# Altium footprint library ICs And Semiconductors SMD.PcbLib: 943 footprints (part 8 of 60)
Each footprint in its own frame and in the unit in brackets; x right, y up, seen from the top. Pads: shape width x height; smd on the part's side, far side on the other; paste and mask are expansions set on the pad; w line width, h text height; cw(c..) or ccw(c..) is an arc to the next point about the centre after c.
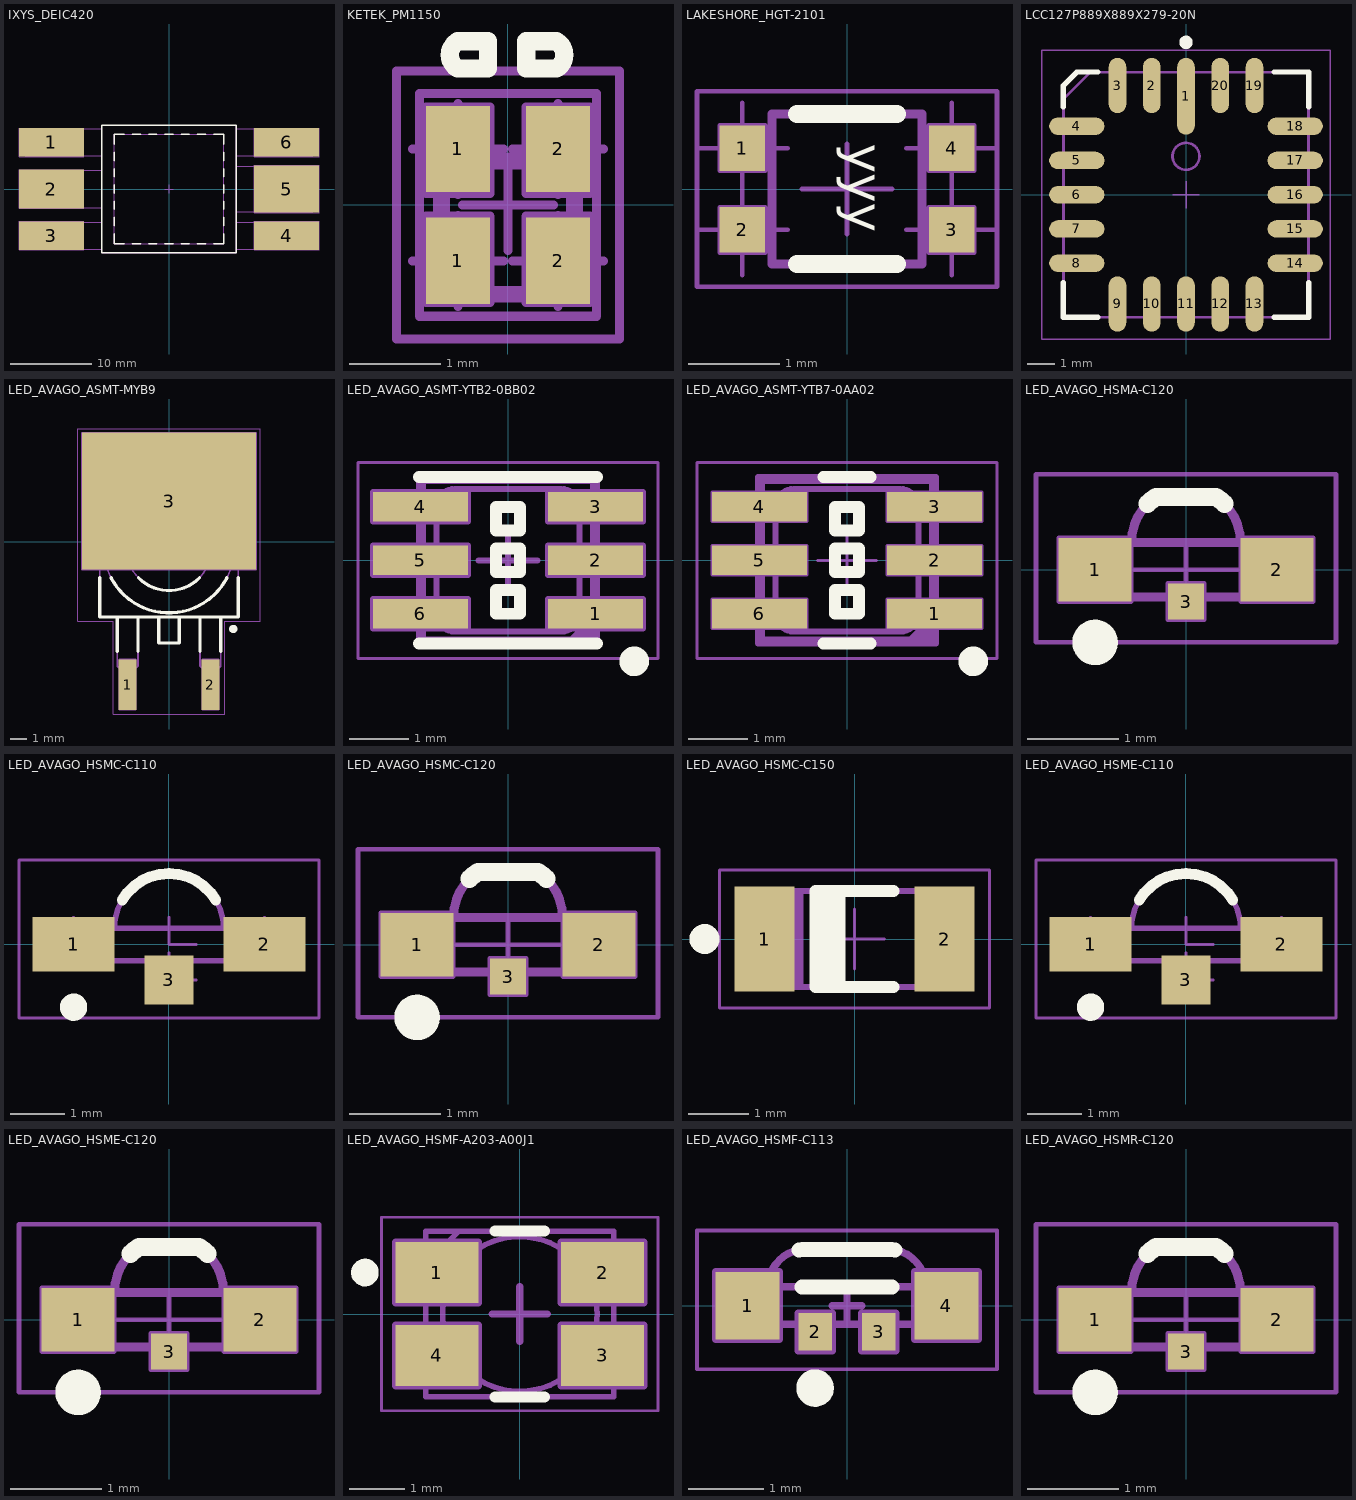
[diagram p7: the footprints below, top view; thin cyan lines are the x and y axes]

## IXYS_DEIC420 [mm] "IXYS DIRECT ENERGY INC. Case DEI420"
height 2.67
pads (6):
  rect 7.95x3.5 smd: 1(-14.425,5.715) 3(-14.425,-5.715) 4(14.425,-5.715) 6(14.425,5.715)
  rect 7.95x4.77 smd: 2(-14.425,0)
  rect 7.95x5.79 smd: 5(14.425,0)
Top Overlay:
  lines w0.2: -6.73,-5.5 -6.73,-6.73 -5.5,-6.73 ; -6.73,-4.5 -6.73,-3.5 ; -6.73,-2.5 -6.73,-1.5 ; -6.73,-0.5 -6.73,0.5 ; -6.73,1.5 -6.73,2.5 ; -6.73,3.5 -6.73,4.5 ; -6.73,5.5 -6.73,6.73 -5.5,6.73 ; -4.5,-6.73 -3.5,-6.73 ; -4.5,6.73 -3.5,6.73 ; -2.5,-6.73 -1.5,-6.73 ; -2.5,6.73 -1.5,6.73 ; -0.5,-6.73 0.5,-6.73 ; -0.5,6.73 0.5,6.73 ; 1.5,-6.73 2.5,-6.73 ; 1.5,6.73 2.5,6.73 ; 3.5,-6.73 4.5,-6.73 ; 3.5,6.73 4.5,6.73 ; 5.5,-6.73 6.73,-6.73 6.73,-5.5 ; 5.5,6.73 6.73,6.73 6.73,5.5 ; 6.73,-4.5 6.73,-3.5 ; 6.73,-2.5 6.73,-1.5 ; 6.73,-0.5 6.73,0.5 ; 6.73,1.5 6.73,2.5 ; 6.73,3.5 6.73,4.5 ; -8.255,-7.8 -8.255,7.8 8.255,7.8 8.255,-7.8 -8.255,-7.8
Mechanical 8:
  lines w0.1: -14.925,-5.715 -14.425,-5.715 ; -14.925,0 -14.425,0 ; -14.925,5.715 -14.425,5.715 ; -14.425,-6.215 -14.425,-5.715 ; -14.425,-5.215 -14.425,-5.715 ; -14.425,-0.5 -14.425,0 ; -14.425,0.5 -14.425,0 ; -14.425,5.215 -14.425,5.715 ; -14.425,6.215 -14.425,5.715 ; -13.925,-5.715 -14.425,-5.715 ; -13.925,0 -14.425,0 ; -13.925,5.715 -14.425,5.715 ; -0.5,0 0,0 ; 0,-0.5 0,0 ; 0,0.5 0,0 ; 0.5,0 0,0 ; 13.925,-5.715 14.425,-5.715 ; 13.925,0 14.425,0 ; 13.925,5.715 14.425,5.715 ; 14.425,-6.215 14.425,-5.715 ; 14.425,-5.215 14.425,-5.715 ; 14.425,-0.5 14.425,0 ; 14.425,0.5 14.425,0 ; 14.425,5.215 14.425,5.715 ; 14.425,6.215 14.425,5.715 ; 14.925,-5.715 14.425,-5.715 ; 14.925,0 14.425,0 ; 14.925,5.715 14.425,5.715 ; -18.4,-7.465 -10.45,-7.465 -10.45,-3.965 -18.4,-3.965 -18.4,-7.465 ; -18.4,-2.385 -10.45,-2.385 -10.45,2.385 -18.4,2.385 -18.4,-2.385 ; -18.4,3.965 -10.45,3.965 -10.45,7.465 -18.4,7.465 -18.4,3.965 ; -6.73,-6.73 6.73,-6.73 6.73,6.73 -6.73,6.73 -6.73,-6.73 ; 10.45,-7.465 18.4,-7.465 18.4,-3.965 10.45,-3.965 10.45,-7.465 ; 10.45,-2.895 18.4,-2.895 18.4,2.895 10.45,2.895 10.45,-2.895 ; 10.45,3.965 18.4,3.965 18.4,7.465 10.45,7.465 10.45,3.965
Mechanical 14:
  lines w0.1: -8.255,-7.365 -17.615,-7.365 -17.615,-4.065 -8.255,-4.065 ; -8.255,-2.285 -17.615,-2.285 -17.615,2.285 -8.255,2.285 ; -8.255,4.065 -17.615,4.065 -17.615,7.365 -8.255,7.365 ; -6.73,-5.5 -6.73,-6.73 -5.5,-6.73 ; -6.73,-4.5 -6.73,-3.5 ; -6.73,-2.5 -6.73,-1.5 ; -6.73,-0.5 -6.73,0.5 ; -6.73,1.5 -6.73,2.5 ; -6.73,3.5 -6.73,4.5 ; -6.73,5.5 -6.73,6.73 -5.5,6.73 ; -4.5,-6.73 -3.5,-6.73 ; -4.5,6.73 -3.5,6.73 ; -2.5,-6.73 -1.5,-6.73 ; -2.5,6.73 -1.5,6.73 ; -0.5,-6.73 0.5,-6.73 ; -0.5,6.73 0.5,6.73 ; 1.5,-6.73 2.5,-6.73 ; 1.5,6.73 2.5,6.73 ; 3.5,-6.73 4.5,-6.73 ; 3.5,6.73 4.5,6.73 ; 5.5,-6.73 6.73,-6.73 6.73,-5.5 ; 5.5,6.73 6.73,6.73 6.73,5.5 ; 6.73,-4.5 6.73,-3.5 ; 6.73,-2.5 6.73,-1.5 ; 6.73,-0.5 6.73,0.5 ; 6.73,1.5 6.73,2.5 ; 6.73,3.5 6.73,4.5 ; 8.255,-7.365 17.615,-7.365 17.615,-4.065 8.255,-4.065 ; 8.255,-2.795 17.615,-2.795 17.615,2.795 8.255,2.795 ; 8.255,4.065 17.615,4.065 17.615,7.365 8.255,7.365 ; -8.255,-7.8 -8.255,7.8 8.255,7.8 8.255,-7.8 -8.255,-7.8
3D body "DEIC420.stp": height 3.3, standoff 0, extent -17.615,-7.8 17.615,7.8

## KETEK_PM1150 [mm] "1.2 x 1.2mm2, 50µm Microcell Type, SMD Silicon Photomultiplier, Body 1.95mm x 2.45mm X 1.8mm"
height 1.9
pads (4):
  rect 0.7x0.95 smd: 1(-0.55,-0.615) 1(-0.55,0.615) 2(0.55,-0.615) 2(0.55,0.615)
Top Overlay:
  lines w0.2: -0.555,1.5 cw(c-0.465,1.65) -0.555,1.8 -0.22,1.8 -0.22,1.5 -0.555,1.5 ; 0.2,1.5 0.2,1.8 0.535,1.8 cw(c0.445,1.65) 0.535,1.5 0.2,1.5
Mechanical 8:
  lines w0.1: -1.05,-0.615 -0.55,-0.615 ; -1.05,0.615 -0.55,0.615 ; -0.55,-1.115 -0.55,-0.615 ; -0.55,-0.115 -0.55,-0.615 ; -0.55,0.115 -0.55,0.615 ; -0.55,1.115 -0.55,0.615 ; -0.5,0 0,0 ; -0.05,-0.615 -0.55,-0.615 ; -0.05,0.615 -0.55,0.615 ; 0,-0.5 0,0 ; 0,0.5 0,0 ; 0.05,-0.615 0.55,-0.615 ; 0.05,0.615 0.55,0.615 ; 0.5,0 0,0 ; 0.55,-1.115 0.55,-0.615 ; 0.55,-0.115 0.55,-0.615 ; 0.55,0.115 0.55,0.615 ; 0.55,1.115 0.55,0.615 ; 1.05,-0.615 0.55,-0.615 ; 1.05,0.615 0.55,0.615 ; -0.9,-1.075 -0.2,-1.075 -0.2,-0.125 -0.9,-0.125 -0.9,-1.075 ; -0.9,0.125 -0.2,0.125 -0.2,1.075 -0.9,1.075 -0.9,0.125 ; 0.2,-1.075 0.9,-1.075 0.9,-0.125 0.2,-0.125 0.2,-1.075 ; 0.2,0.125 0.9,0.125 0.9,1.075 0.2,1.075 0.2,0.125
Mechanical 14:
  lines w0.1: -0.975,-1.225 -0.975,1.225 0.975,1.225 0.975,-1.225 -0.975,-1.225 ; -0.775,-1.025 0.775,-1.025 0.775,0.525 -0.775,0.525 -0.775,-1.025 ; -0.69,-0.94 0.69,-0.94 0.69,0.44 -0.69,0.44 -0.69,-0.94 ; -0.555,0.725 cw(c-0.465,0.875) -0.555,1.025 -0.22,1.025 -0.22,0.725 -0.555,0.725 ; 0.2,0.725 0.535,0.725 ccw(c0.445,0.875) 0.535,1.025 0.2,1.025 0.2,0.725
Mechanical 15:
  lines w0.1: -1.225,-1.475 -1.225,1.475 1.225,1.475 1.225,-1.475 -1.225,-1.475
3D body "KETEK_PM1150_Part2.stp": height 1.9, standoff 0.9, extent -0.975,-1.225 0.975,1.225
3D body "KETEK_PM1150_Part1.stp": height 1.63, standoff 0, extent -0.975,-1.225 0.975,1.225

## LAKESHORE_HGT-2101 [mm] "0.9mm Ptich; 4 Pin, 1.5mm W X 1.5mm L X 0.6mm H Body, LAKESHORE HGT-2101"
height 1.65
pads (4):
  rect 0.5x0.5 smd: 1(-1.15,0.45) 2(-1.15,-0.45) 3(1.15,-0.45) 4(1.15,0.45)
Top Overlay:
  lines w0.2: -0.55,-0.825 0.55,-0.825 ; -0.55,0.825 0.55,0.825
  text "yyy" at 0,0.5 h0.4
Mechanical 8:
  lines w0.05: -1.65,-0.45 -1.15,-0.45 ; -1.65,0.45 -1.15,0.45 ; -1.15,-0.95 -1.15,-0.45 ; -1.15,0.95 -1.15,0.45 ; -0.65,-0.45 -1.15,-0.45 ; -0.65,0.45 -1.15,0.45 ; -0.5,0 0,0 ; 0,-0.5 0,0 ; 0,0.5 0,0 ; 0.5,0 0,0 ; 0.65,-0.45 1.15,-0.45 ; 0.65,0.45 1.15,0.45 ; 1.15,-0.95 1.15,-0.45 ; 1.15,0.95 1.15,0.45 ; 1.65,-0.45 1.15,-0.45 ; 1.65,0.45 1.15,0.45 ; -1.15,-0.45 -1.15,0.45 ; 1.15,-0.45 1.15,0.45 ; -1.4,-0.7 -0.9,-0.7 -0.9,-0.2 -1.4,-0.2 -1.4,-0.7 ; -1.4,0.2 -0.9,0.2 -0.9,0.7 -1.4,0.7 -1.4,0.2 ; 0.9,-0.7 1.4,-0.7 1.4,-0.2 0.9,-0.2 0.9,-0.7 ; 0.9,0.2 1.4,0.2 1.4,0.7 0.9,0.7 0.9,0.2
Mechanical 14:
  lines w0.1: -0.825,-0.6 -1.25,-0.6 -1.25,-0.3 -0.825,-0.3 ; -0.825,0.3 -1.25,0.3 -1.25,0.6 -0.825,0.6 ; 0.825,-0.6 1.25,-0.6 1.25,-0.3 0.825,-0.3 ; 0.825,0.3 1.25,0.3 1.25,0.6 0.825,0.6 ; -0.825,-0.825 -0.825,0.825 0.825,0.825 0.825,-0.825 -0.825,-0.825
  text "yyy" at 0,0.5 h0.4
Mechanical 15:
  lines w0.05: -1.65,-1.075 -1.65,1.075 1.65,1.075 1.65,-1.075 -1.65,-1.075
3D body "LAKESHORE_HGT-2101.stp": height 0.7, standoff -0.05, extent -1.25,-0.825 1.25,0.825

## LCC127P889X889X279-20N [mm] "LCC,1.27mm pitch, square, 5 pin X 5 pin, 8.89mm X 8.89mm X 2.79mm H 2.79mm"
height 2.79
pads (20):
  oval 0.65x2.85 smd: 1(0,3.65)
  oval 0.65x2.05 smd: 2(-1.27,4.05) 3(-2.54,4.05) 9(-2.54,-4.05) 10(-1.27,-4.05) 11(0,-4.05) 12(1.27,-4.05) 13(2.54,-4.05) 19(2.54,4.05) 20(1.27,4.05)
  oval 2.05x0.65 smd: 4(-4.05,2.54) 5(-4.05,1.27) 6(-4.05,0) 7(-4.05,-1.27) 8(-4.05,-2.54) 14(4.05,-2.54) 15(4.05,-1.27) 16(4.05,0) 17(4.05,1.27) 18(4.05,2.54)
Top Overlay:
  circle w0.25: c0,5.65 r0.125
  lines w0.2: -4.55,-3.265 -4.55,-4.55 -3.265,-4.55 ; -4.55,3.265 -4.55,4.05 -4.05,4.55 -3.265,4.55 ; 3.265,-4.55 4.55,-4.55 4.55,-3.265 ; 3.265,4.55 4.55,4.55 4.55,3.265
Mechanical 14:
  circle w0.1: c0,1.425 r0.5
  lines w0.1: -4.545,-4.545 4.545,-4.545 4.545,4.545 -3.545,4.545 -4.545,3.545 -4.545,-4.545
Mechanical 15:
  lines w0.05: -0.5,0 0.5,0 ; 0,-0.5 0,0.5 ; -5.35,-5.35 5.35,-5.35 5.35,5.35 -5.35,5.35 -5.35,-5.35
3D body "LCC127P889X889X279-20N.stp": height 2.79, standoff 0, extent -4.545,-4.545 4.545,4.545
3D body: height 1.8, standoff 0, extent 0.92,3.15 1.62,4.55
3D body: height 1.8, standoff 0, extent 2.2,3.15 2.9,4.55
3D body: height 1.8, standoff 0, extent 3.15,2.19 4.55,2.89
3D body: height 1.8, standoff 0, extent 3.15,0.92 4.55,1.62
3D body: height 1.8, standoff 0, extent 3.15,-0.35 4.55,0.35
3D body: height 1.8, standoff 0, extent 3.15,-1.62 4.55,-0.92
3D body: height 1.8, standoff 0, extent 3.15,-2.89 4.55,-2.19
3D body: height 1.8, standoff 0, extent 2.19,-4.55 2.89,-3.15
3D body: height 1.8, standoff 0, extent 0.92,-4.55 1.62,-3.15
3D body: height 1.8, standoff 0, extent -0.35,-4.55 0.35,-3.15
3D body: height 1.8, standoff 0, extent -1.62,3.15 -0.92,4.55
3D body: height 1.8, standoff 0, extent -2.89,3.15 -2.19,4.55
3D body: height 1.8, standoff 0, extent -4.55,2.19 -3.15,2.89
3D body: height 1.8, standoff 0, extent -4.55,0.92 -3.15,1.62
3D body: height 1.8, standoff 0, extent -4.55,-0.35 -3.15,0.35
3D body: height 1.8, standoff 0, extent -4.55,-1.62 -3.15,-0.92
3D body: height 1.8, standoff 0, extent -4.55,-2.89 -3.15,-2.19
3D body: height 1.8, standoff 0, extent -2.89,-4.55 -2.19,-3.15
3D body: height 1.8, standoff 0, extent -1.62,-4.55 -0.92,-3.15
3D body: height 1.8, standoff 0, extent -0.35,2.3 0.35,4.55

## LED_AVAGO_ASMT-MYB9 [mm] "Warm White LED, Body 10x10.6mm, Pin spacing 5.08mm (Exposed Pad 10.7mm x 8.4mm)"
height 3.3
pads (3):
  rect 1.1x3.1 smd: 1(-2.54,-8.75) 2(2.54,-8.75)
  rect 10.7x8.4 smd: 3(0,2.5)
Top Overlay:
  circle w0.25: c3.939,-5.334 r0.125
  lines w0.2: -4.25,-2.2 -4.25,-4.6 4.25,-4.6 4.25,-2.2 ; -3.546,-2.2 ccw(c0,-0.35) 3.546,-2.2 ; -3.175,-6.7 -3.175,-4.6 ; -1.905,-6.7 -1.905,-4.6 ; -1.869,-2.2 ccw(c0,-0.35) 1.869,-2.2 ; -0.635,-4.6 -0.635,-6.2 0.635,-6.2 0.635,-4.6 ; 1.905,-6.7 1.905,-4.6 ; 3.175,-6.7 3.175,-4.6
Mechanical 8:
  lines w0.1: -3.04,-8.75 -2.54,-8.75 ; -2.54,-9.25 -2.54,-8.75 ; -2.54,-8.25 -2.54,-8.75 ; -2.04,-8.75 -2.54,-8.75 ; -0.5,0 0,0 ; -0.5,2.5 0,2.5 ; 0,-0.5 0,0 ; 0,0.5 0,0 ; 0,2 0,2.5 ; 0,3 0,2.5 ; 0.5,0 0,0 ; 0.5,2.5 0,2.5 ; 2.04,-8.75 2.54,-8.75 ; 2.54,-9.25 2.54,-8.75 ; 2.54,-8.25 2.54,-8.75 ; 3.04,-8.75 2.54,-8.75 ; -5.35,-1.7 -5.35,6.7 5.35,6.7 5.35,-1.7 -5.35,-1.7 ; -3.04,-10.3 -3.04,-7.2 -2.04,-7.2 -2.04,-10.3 -3.04,-10.3 ; 2.04,-10.3 2.04,-7.2 3.04,-7.2 3.04,-10.3 2.04,-10.3
Mechanical 14:
  circle w0.1: c0,-0.35 r4
  circle w0.1: c0,-0.35 r2.63
  lines w0.1: -3.5,3.9 -3.5,4.73 -5,4.73 -5,5.5 -4.5,6 4.5,6 5,5.5 5,4.73 3.5,4.73 3.5,3.9 ; -3.175,-4.6 -3.175,-7.62 -2.945,-7.85 -2.945,-9.85 -2.135,-9.85 -2.135,-7.85 -1.905,-7.62 -1.905,-4.6 ; -0.635,-4.6 -0.635,-6.2 0.635,-6.2 0.635,-4.6 ; 1.905,-4.6 1.905,-7.62 2.135,-7.85 2.135,-9.85 2.945,-9.85 2.945,-7.85 3.175,-7.62 3.175,-4.6 ; -4.25,-4.6 4.25,-4.6 4.25,3.9 -4.25,3.9 -4.25,-4.6
Mechanical 15:
  lines w0.05: -5.6,-4.85 -3.425,-4.85 -3.425,-10.55 3.425,-10.55 3.425,-4.85 5.6,-4.85 5.6,6.95 -5.6,6.95 -5.6,-4.85
3D body "LED_AVAGO_ASMT-MYB9-NKM00.stp": height 3.3, standoff 0, extent -5,-9.85 5,6

## LED_AVAGO_ASMT-YTB2-0BB02 [mm] "High Brightness Tricolor (RGB) Surface Mount LED, Body 3x2.8mm"
height 1.8
pads (6):
  rect 1.6x0.5 smd: 1(1.475,-0.9) 2(1.475,0) 3(1.475,0.9) 4(-1.475,0.9) 5(-1.475,0) 6(-1.475,-0.9)
Top Overlay:
  circle w0.25: c2.125,-1.7 r0.125
  lines w0.2: -1.5,-1.4 1.5,-1.4 ; -1.5,1.4 1.5,1.4 ; -0.2,-0.9 -0.2,-0.5 0.2,-0.5 0.2,-0.9 -0.2,-0.9 ; -0.2,-0.2 -0.2,0.2 0.2,0.2 0.2,-0.2 -0.2,-0.2 ; -0.2,0.5 0.2,0.5 0.2,0.9 -0.2,0.9 -0.2,0.5
Mechanical 8:
  lines w0.1: -1.975,-0.9 -1.475,-0.9 ; -1.975,0 -1.475,0 ; -1.975,0.9 -1.475,0.9 ; -1.475,-1.4 -1.475,-0.9 ; -1.475,1.4 -1.475,0.9 ; -0.975,-0.9 -1.475,-0.9 ; -0.975,0 -1.475,0 ; -0.975,0.9 -1.475,0.9 ; -0.5,0 0,0 ; 0,-0.5 0,0 ; 0,0.5 0,0 ; 0.5,0 0,0 ; 0.975,-0.9 1.475,-0.9 ; 0.975,0 1.475,0 ; 0.975,0.9 1.475,0.9 ; 1.475,-1.4 1.475,-0.9 ; 1.475,1.4 1.475,0.9 ; 1.975,-0.9 1.475,-0.9 ; 1.975,0 1.475,0 ; 1.975,0.9 1.475,0.9 ; -1.475,-0.9 -1.475,0 ; -1.475,0 -1.475,0.9 ; 1.475,-0.9 1.475,0 ; 1.475,0 1.475,0.9 ; -2.275,-1.15 -2.275,-0.65 -0.675,-0.65 -0.675,-1.15 -2.275,-1.15 ; -2.275,-0.25 -2.275,0.25 -0.675,0.25 -0.675,-0.25 -2.275,-0.25 ; -2.275,0.65 -2.275,1.15 -0.675,1.15 -0.675,0.65 -2.275,0.65 ; 0.675,-1.15 0.675,-0.65 2.275,-0.65 2.275,-1.15 0.675,-1.15 ; 0.675,-0.25 0.675,0.25 2.275,0.25 2.275,-0.25 0.675,-0.25 ; 0.675,0.65 0.675,1.15 2.275,1.15 2.275,0.65 0.675,0.65
Mechanical 14:
  lines w0.1: 1.07,-1.33 1.43,-0.97 ; 1.195,-1.33 1.43,-1.095 ; 1.27,-1.355 1.43,-1.195 ; -1.5,-1.4 -1.43,-1.33 ; -1.5,-1.4 1.5,-1.4 ; -1.5,-1.4 -1.5,1.4 ; -1.5,1.4 -1.43,1.33 ; -1.5,1.4 1.5,1.4 ; -1.43,-1.33 -1.43,1.33 ; -1.43,-1.33 1.43,-1.33 ; -1.43,1.33 1.43,1.33 ; 1.43,-1.33 1.5,-1.4 ; 1.43,-1.33 1.43,1.33 ; 1.43,1.33 1.5,1.4 ; 1.5,-1.4 1.5,1.4 ; -1.2,-0.9 ccw(c-0.9,-0.9) -0.9,-1.2 0.9,-1.2 ccw(c0.9,-0.9) 1.2,-0.9 1.2,0.9 ccw(c0.9,0.9) 0.9,1.2 -0.9,1.2 ccw(c-0.9,0.9) -1.2,0.9 -1.2,-0.9 ; -0.2,-0.9 -0.2,-0.5 0.2,-0.5 0.2,-0.9 -0.2,-0.9 ; -0.2,-0.2 -0.2,0.2 0.2,0.2 0.2,-0.2 -0.2,-0.2 ; -0.2,0.5 0.2,0.5 0.2,0.9 -0.2,0.9 -0.2,0.5
Mechanical 15:
  lines w0.05: -2.525,-1.65 2.525,-1.65 2.525,1.65 -2.525,1.65 -2.525,-1.65
3D body "LED_AVAGO_ASMT-YTB2-0BB02.stp": height 1.8, standoff 0, extent -1.7,-1.4 1.7,1.4

## LED_AVAGO_ASMT-YTB7-0AA02 [mm] "High Brightness Tricolor (RGB) Surface Mount LED, Body 3x2.8mm"
height 1.8
pads (6):
  rect 1.6x0.5 smd: 1(1.475,-0.9) 2(1.475,0) 3(1.475,0.9) 4(-1.475,0.9) 5(-1.475,0) 6(-1.475,-0.9)
Top Overlay:
  circle w0.25: c2.125,-1.7 r0.125
  lines w0.2: -0.4,-1.4 0.4,-1.4 ; -0.4,1.4 0.4,1.4 ; -0.2,-0.9 -0.2,-0.5 0.2,-0.5 0.2,-0.9 -0.2,-0.9 ; -0.2,-0.2 -0.2,0.2 0.2,0.2 0.2,-0.2 -0.2,-0.2 ; -0.2,0.5 0.2,0.5 0.2,0.9 -0.2,0.9 -0.2,0.5
Mechanical 8:
  lines w0.05: -1.975,-0.9 -1.475,-0.9 ; -1.975,0 -1.475,0 ; -1.975,0.9 -1.475,0.9 ; -1.475,-1.4 -1.475,-0.9 ; -1.475,1.4 -1.475,0.9 ; -0.975,-0.9 -1.475,-0.9 ; -0.975,0 -1.475,0 ; -0.975,0.9 -1.475,0.9 ; -0.5,0 0,0 ; 0,-0.5 0,0 ; 0,0.5 0,0 ; 0.5,0 0,0 ; 0.975,-0.9 1.475,-0.9 ; 0.975,0 1.475,0 ; 0.975,0.9 1.475,0.9 ; 1.475,-1.4 1.475,-0.9 ; 1.475,1.4 1.475,0.9 ; 1.975,-0.9 1.475,-0.9 ; 1.975,0 1.475,0 ; 1.975,0.9 1.475,0.9 ; -1.475,-0.9 -1.475,0 ; -1.475,0 -1.475,0.9 ; 1.475,-0.9 1.475,0 ; 1.475,0 1.475,0.9 ; -2.275,-1.15 -2.275,-0.65 -0.675,-0.65 -0.675,-1.15 -2.275,-1.15 ; -2.275,-0.25 -2.275,0.25 -0.675,0.25 -0.675,-0.25 -2.275,-0.25 ; -2.275,0.65 -2.275,1.15 -0.675,1.15 -0.675,0.65 -2.275,0.65 ; 0.675,-1.15 0.675,-0.65 2.275,-0.65 2.275,-1.15 0.675,-1.15 ; 0.675,-0.25 0.675,0.25 2.275,0.25 2.275,-0.25 0.675,-0.25 ; 0.675,0.65 0.675,1.15 2.275,1.15 2.275,0.65 0.675,0.65
Mechanical 14:
  lines w0.1: 1.07,-1.33 1.43,-0.97 ; 1.195,-1.33 1.43,-1.095 ; 1.27,-1.355 1.43,-1.195 ; -1.5,-1.4 -1.43,-1.33 ; -1.5,-1.4 1.5,-1.4 ; -1.5,-1.4 -1.5,1.4 ; -1.5,1.4 -1.43,1.33 ; -1.5,1.4 1.5,1.4 ; -1.43,-1.33 -1.43,1.33 ; -1.43,-1.33 1.43,-1.33 ; -1.43,1.33 1.43,1.33 ; 1.43,-1.33 1.5,-1.4 ; 1.43,-1.33 1.43,1.33 ; 1.43,1.33 1.5,1.4 ; 1.5,-1.4 1.5,1.4 ; -1.2,-0.9 ccw(c-0.9,-0.9) -0.9,-1.2 0.9,-1.2 ccw(c0.9,-0.9) 1.2,-0.9 1.2,0.9 ccw(c0.9,0.9) 0.9,1.2 -0.9,1.2 ccw(c-0.9,0.9) -1.2,0.9 -1.2,-0.9 ; -0.2,-0.9 -0.2,-0.5 0.2,-0.5 0.2,-0.9 -0.2,-0.9 ; -0.2,-0.2 -0.2,0.2 0.2,0.2 0.2,-0.2 -0.2,-0.2 ; -0.2,0.5 0.2,0.5 0.2,0.9 -0.2,0.9 -0.2,0.5
Mechanical 15:
  lines w0.05: -2.525,-1.65 2.525,-1.65 2.525,1.65 -2.525,1.65 -2.525,-1.65
3D body "LED_AVAGO_ASMT-YTB2-0BB02.stp": height 1.8, standoff 0, extent -1.7,-1.4 1.7,1.4

## LED_AVAGO_HSMA-C120 [mm] "Amber Chip LED, 2-Leads, Body 1.7x1.1mm, Side Emitting Package"
height 0.7
pads (3):
  rect 0.8x0.7 smd: 1(-1,0) 2(1,0)
  rect 0.4x0.4 smd: 3(0,-0.35)
Top Overlay:
  circle w0.25: c-1,-0.8 r0.125
  lines w0.2: -0.424,0.724 cw(c0,0.3) -0.332,0.8 0.332,0.8 cw(c0,0.3) 0.424,0.724
Mechanical 8:
  lines w0.05: -1,0 1,0 ; 0,-0.35 0,0 ; -1.4,-0.35 -0.6,-0.35 -0.6,0.35 -1.4,0.35 -1.4,-0.35 ; -0.2,-0.55 -0.2,-0.15 0.2,-0.15 0.2,-0.55 -0.2,-0.55 ; 0.6,-0.35 1.4,-0.35 1.4,0.35 0.6,0.35 0.6,-0.35
Mechanical 14:
  lines w0.1: -0.6,0.3 cw(c0,0.3) -0.332,0.8 0.332,0.8 cw(c0,0.3) 0.6,0.3 ; -0.85,-0.3 -0.85,0.3 0.85,0.3 0.85,-0.3 -0.85,-0.3
Mechanical 15:
  lines w0.05: -0.3,0 0.3,0 ; 0,-0.3 0,0.3 ; -1.65,-0.8 1.65,-0.8 1.65,1.05 -1.65,1.05 -1.65,-0.8
3D body "LED_AVAGO_HSMA-C120.stp": height 0.7, standoff 0, extent -0.85,-0.3 0.85,0.8

## LED_AVAGO_HSMC-C110 [mm] "Red Chip LED, 2-Leads, Body 3.3x1.6mm, Side Emitting Package"
height 1.1
pads (3):
  rect 1.5x1 smd: 1(-1.75,0) 2(1.75,0)
  rect 0.9x0.9 smd: 3(0,-0.65)
Top Overlay:
  circle w0.25: c-1.75,-1.15 r0.125
  lines w0.2: -0.857,0.814 cw(c0,0.3) 0.857,0.814
Mechanical 8:
  lines w0.05: -1.75,0.5 -1.75,0 -1.25,0 ; 0,-0.15 0,-0.65 0.5,-0.65 ; 0,0.5 0,0 0.5,0 ; 1.75,0.5 1.75,0 2.25,0
  text "K" at 1.483,0.25 h0.5
Mechanical 14:
  lines w0.1: -1,0.3 cw(c0,0.3) 1,0.3 ; -1.65,-0.3 -1.65,0.3 1.65,0.3 1.65,-0.3 -1.65,-0.3
Mechanical 15:
  lines w0.05: -2.75,-1.35 -2.75,1.55 2.75,1.55 2.75,-1.35 -2.75,-1.35
3D body "LED_AVAGO_HSMC-C110.stp": height 1, standoff 0, extent -1.65,-0.3 1.65,1.3

## LED_AVAGO_HSMC-C120 [mm] "Red Chip LED, 2-Leads, Body 1.7x1.1mm, Side Emitting Package"
height 0.7
pads (3):
  rect 0.8x0.7 smd: 1(-1,0) 2(1,0)
  rect 0.4x0.4 smd: 3(0,-0.35)
Top Overlay:
  circle w0.25: c-1,-0.8 r0.125
  lines w0.2: -0.424,0.724 cw(c0,0.3) -0.332,0.8 0.332,0.8 cw(c0,0.3) 0.424,0.724
Mechanical 8:
  lines w0.05: -1,0 1,0 ; 0,-0.35 0,0 ; -1.4,-0.35 -1.4,0.35 -0.6,0.35 -0.6,-0.35 -1.4,-0.35 ; -0.2,-0.55 0.2,-0.55 0.2,-0.15 -0.2,-0.15 -0.2,-0.55 ; 0.6,-0.35 0.6,0.35 1.4,0.35 1.4,-0.35 0.6,-0.35
Mechanical 14:
  lines w0.1: -0.6,0.3 cw(c0,0.3) -0.332,0.8 0.332,0.8 cw(c0,0.3) 0.6,0.3 ; -0.85,-0.3 0.85,-0.3 0.85,0.3 -0.85,0.3 -0.85,-0.3
Mechanical 15:
  lines w0.05: -0.3,0 0.3,0 ; 0,-0.3 0,0.3 ; -1.65,-0.8 -1.65,1.05 1.65,1.05 1.65,-0.8 -1.65,-0.8
3D body "LED_AVAGO_HSMC-C120.stp": height 0.7, standoff 0, extent -0.85,-0.3 0.85,0.8

## LED_AVAGO_HSMC-C150 [mm] "Red Chip LED, 2-Leads, Body 3.2 x1.6mm, IPC Medium Density"
height 1.2
pads (2):
  rect 1x1.75 smd: 1(-1.5,0) 2(1.5,0)
Top Overlay:
  circle w0.25: c-2.5,0 r0.125
  lines w0.2: -0.45,-0.8 -0.45,0.8 ; -0.25,-0.8 -0.25,0.8 ; 0.65,-0.8 -0.65,-0.8 -0.65,0.8 0.65,0.8
Mechanical 14:
  lines w0.1: -1.5,-0.8 -1.5,0.8 ; -1.4,-0.8 -1.4,0.8 ; -1.3,-0.8 -1.3,0.8 ; -1.2,-0.8 -1.2,0.8 ; -1.1,-0.8 -1.1,0.8 ; -1,-0.8 -1,0.8 ; -0.9,-0.8 -0.9,0.8 ; -1.6,-0.8 1.6,-0.8 1.6,0.8 -1.6,0.8 -1.6,-0.8
Mechanical 15:
  lines w0.05: -0.5,0 0.5,0 ; 0,-0.5 0,0.5 ; -2.25,-1.15 2.25,-1.15 2.25,1.15 -2.25,1.15 -2.25,-1.15
3D body "LED_AVAGO_HSMC-C150.stp": height 1.2, standoff 0, extent -1.65,-0.85 1.65,0.85

## LED_AVAGO_HSME-C110 [mm] "Green Chip LED, 2-Leads, Body 3.3x1.6mm, Side Emitting Package"
height 1.1
pads (3):
  rect 1.5x1 smd: 1(-1.75,0) 2(1.75,0)
  rect 0.9x0.9 smd: 3(0,-0.65)
Top Overlay:
  circle w0.25: c-1.75,-1.15 r0.125
  lines w0.2: -0.857,0.814 cw(c0,0.3) 0.857,0.814
Mechanical 8:
  lines w0.05: -1.75,0.5 -1.75,0 -1.25,0 ; 0,-0.15 0,-0.65 0.5,-0.65 ; 0,0.5 0,0 0.5,0 ; 1.75,0.5 1.75,0 2.25,0
  text "K" at 1.483,0.25 h0.5
Mechanical 14:
  lines w0.1: -1,0.3 cw(c0,0.3) 1,0.3 ; -1.65,-0.3 1.65,-0.3 1.65,0.3 -1.65,0.3 -1.65,-0.3
Mechanical 15:
  lines w0.05: -2.75,-1.35 2.75,-1.35 2.75,1.55 -2.75,1.55 -2.75,-1.35
3D body "LED_AVAGO_HSME-C110.stp": height 1, standoff 0, extent -1.65,-0.3 1.65,1.3

## LED_AVAGO_HSME-C120 [mm] "Green Chip LED, 2-Leads, Body 1.7x1.1mm, Side Emitting Package"
height 0.7
pads (3):
  rect 0.8x0.7 smd: 1(-1,0) 2(1,0)
  rect 0.4x0.4 smd: 3(0,-0.35)
Top Overlay:
  circle w0.25: c-1,-0.8 r0.125
  lines w0.2: -0.424,0.724 cw(c0,0.3) -0.332,0.8 0.332,0.8 cw(c0,0.3) 0.424,0.724
Mechanical 8:
  lines w0.05: -1,0 1,0 ; 0,-0.35 0,0 ; -1.4,-0.35 -0.6,-0.35 -0.6,0.35 -1.4,0.35 -1.4,-0.35 ; -0.2,-0.55 -0.2,-0.15 0.2,-0.15 0.2,-0.55 -0.2,-0.55 ; 0.6,-0.35 1.4,-0.35 1.4,0.35 0.6,0.35 0.6,-0.35
Mechanical 14:
  lines w0.1: -0.6,0.3 cw(c0,0.3) -0.332,0.8 0.332,0.8 cw(c0,0.3) 0.6,0.3 ; -0.85,-0.3 -0.85,0.3 0.85,0.3 0.85,-0.3 -0.85,-0.3
Mechanical 15:
  lines w0.05: -0.3,0 0.3,0 ; 0,-0.3 0,0.3 ; -1.65,-0.8 1.65,-0.8 1.65,1.05 -1.65,1.05 -1.65,-0.8
3D body "LED_AVAGO_HSME-C120.stp": height 0.7, standoff 0, extent -0.85,-0.3 0.85,0.8

## LED_AVAGO_HSMF-A203-A00J1 [mm] "Surface Mount Red/Green Bicolor LED, Body 3.2mm X 2.8mm"
height 2.1
pads (4):
  rect 1.5x1.1 smd: 1(-1.5,0.75) 2(1.5,0.75) 3(1.5,-0.75) 4(-1.5,-0.75)
Top Overlay:
  circle w0.25: c-2.8,0.75 r0.125
  lines w0.2: -0.45,-1.5 0.45,-1.5 ; -0.45,1.5 0.45,1.5
Mechanical 8:
  lines w0.127: -2,-0.75 -1.5,-0.75 ; -2,0.75 -1.5,0.75 ; -1.5,-1.25 -1.5,-0.75 ; -1.5,-0.25 -1.5,-0.75 ; -1.5,0.25 -1.5,0.75 ; -1.5,1.25 -1.5,0.75 ; -1,-0.75 -1.5,-0.75 ; -1,0.75 -1.5,0.75 ; -0.5,0 0,0 ; 0,-0.5 0,0 ; 0,0.5 0,0 ; 0.5,0 0,0 ; 1,-0.75 1.5,-0.75 ; 1,0.75 1.5,0.75 ; 1.5,-1.25 1.5,-0.75 ; 1.5,-0.25 1.5,-0.75 ; 1.5,0.25 1.5,0.75 ; 1.5,1.25 1.5,0.75 ; 2,-0.75 1.5,-0.75 ; 2,0.75 1.5,0.75 ; -2.25,-1.3 -2.25,-0.2 -0.75,-0.2 -0.75,-1.3 -2.25,-1.3 ; -2.25,0.2 -2.25,1.3 -0.75,1.3 -0.75,0.2 -2.25,0.2 ; 0.75,-1.3 0.75,-0.2 2.25,-0.2 2.25,-1.3 0.75,-1.3 ; 0.75,0.2 0.75,1.3 2.25,1.3 2.25,0.2 0.75,0.2
Mechanical 14:
  circle w0.1: c0,0 r1.4
  lines w0.1: -1.7,-1.1 -1.85,-1.1 -1.85,-0.3 -1.7,-0.3 ; -1.7,0.3 -1.85,0.3 -1.85,1.1 -1.7,1.1 ; -1.7,0.9 -1.1,1.5 ; 1.7,-1.1 1.85,-1.1 1.85,-0.3 1.7,-0.3 ; 1.7,0.3 1.85,0.3 1.85,1.1 1.7,1.1 ; -1.7,-1.5 1.7,-1.5 1.7,1.5 -1.7,1.5 -1.7,-1.5
Mechanical 15:
  lines w0.05: -2.5,-1.75 -2.5,1.75 2.5,1.75 2.5,-1.75 -2.5,-1.75
3D body "LED_AVAGO_HSMF-A203-A00J1.stp": height 2.1, standoff 0, extent -1.85,-1.5 1.85,1.5

## LED_AVAGO_HSMF-C113 [mm] "Right Angle Tricolor Surface Mount ChipLED, Body 2.5x1mm"
height 1.1
pads (4):
  rect 0.85x0.9 smd: 1(-1.325,0) 4(1.325,0)
  rect 0.45x0.5 smd: 2(-0.425,-0.35) 3(0.425,-0.35)
Top Overlay:
  circle w0.25: c-0.425,-1.1 r0.125
  lines w0.2: -0.637,0.742 cw(c-0.55,0.25) -0.55,0.75 0.55,0.75 cw(c0.55,0.25) 0.637,0.742 ; -0.6,0.25 0.6,0.25
Mechanical 8:
  lines w0.1: -1.525,0 -1.325,0 ; -1.325,-0.2 -1.325,0 ; -1.325,0.2 -1.325,0 ; -1.125,0 -1.325,0 ; -0.625,-0.35 -0.425,-0.35 ; -0.425,-0.55 -0.425,-0.35 ; -0.425,-0.15 -0.425,-0.35 ; -0.225,-0.35 -0.425,-0.35 ; -0.2,0 0,0 ; 0,-0.2 0,0 ; 0,0.2 0,0 ; 0.2,0 0,0 ; 0.225,-0.35 0.425,-0.35 ; 0.425,-0.55 0.425,-0.35 ; 0.425,-0.15 0.425,-0.35 ; 0.625,-0.35 0.425,-0.35 ; 1.125,0 1.325,0 ; 1.325,-0.2 1.325,0 ; 1.325,0.2 1.325,0 ; 1.525,0 1.325,0 ; -1.75,-0.45 -0.9,-0.45 -0.9,0.45 -1.75,0.45 -1.75,-0.45 ; -0.65,-0.6 -0.2,-0.6 -0.2,-0.1 -0.65,-0.1 -0.65,-0.6 ; 0.2,-0.6 0.65,-0.6 0.65,-0.1 0.2,-0.1 0.2,-0.6 ; 0.9,-0.45 1.75,-0.45 1.75,0.45 0.9,0.45 0.9,-0.45
  text "C" at -0.6,-1.325 h0.5
Mechanical 14:
  circle w0.1: c-0.425,-1.1 r0.125
  lines w0.1: 1.25,0.25 1.25,-0.25 -1.25,-0.25 -1.25,0.25 -1.05,0.25 ; -1.05,0.25 cw(c-0.55,0.25) -0.55,0.75 0.55,0.75 cw(c0.55,0.25) 1.05,0.25 -1.05,0.25
Mechanical 15:
  lines w0.05: -2,-0.85 2,-0.85 2,1 -2,1 -2,-0.85
3D body "LED_AVAGO_HSMF-C113.stp": height 1, standoff 0, extent -1.25,-0.25 1.25,0.75

## LED_AVAGO_HSMR-C120 [mm] "Blue Chip LED, 2-Leads, Body 1.7x1.1mm, Side Emitting Package"
height 0.7
pads (3):
  rect 0.8x0.7 smd: 1(-1,0) 2(1,0)
  rect 0.4x0.4 smd: 3(0,-0.35)
Top Overlay:
  circle w0.25: c-1,-0.8 r0.125
  lines w0.2: -0.424,0.724 cw(c0,0.3) -0.332,0.8 0.332,0.8 cw(c0,0.3) 0.424,0.724
Mechanical 8:
  lines w0.05: -1,0 1,0 ; 0,-0.35 0,0 ; -1.4,-0.35 -0.6,-0.35 -0.6,0.35 -1.4,0.35 -1.4,-0.35 ; -0.2,-0.55 -0.2,-0.15 0.2,-0.15 0.2,-0.55 -0.2,-0.55 ; 0.6,-0.35 1.4,-0.35 1.4,0.35 0.6,0.35 0.6,-0.35
Mechanical 14:
  lines w0.1: -0.6,0.3 cw(c0,0.3) -0.332,0.8 0.332,0.8 cw(c0,0.3) 0.6,0.3 ; -0.85,-0.3 -0.85,0.3 0.85,0.3 0.85,-0.3 -0.85,-0.3
Mechanical 15:
  lines w0.05: -0.3,0 0.3,0 ; 0,-0.3 0,0.3 ; -1.65,-0.8 1.65,-0.8 1.65,1.05 -1.65,1.05 -1.65,-0.8
3D body "LED_AVAGO_HSMR-C120.stp": height 0.7, standoff 0, extent -0.85,-0.3 0.85,0.8